# Altium footprint library lib_datalogger.PcbLib: 866 footprints (part 46 of 55)
Each footprint in its own frame and in the unit in brackets; x right, y up, seen from the top. Pads: shape width x height; smd on the part's side, far side on the other; paste and mask are expansions set on the pad; w line width, h text height; cw(c..) or ccw(c..) is an arc to the next point about the centre after c.
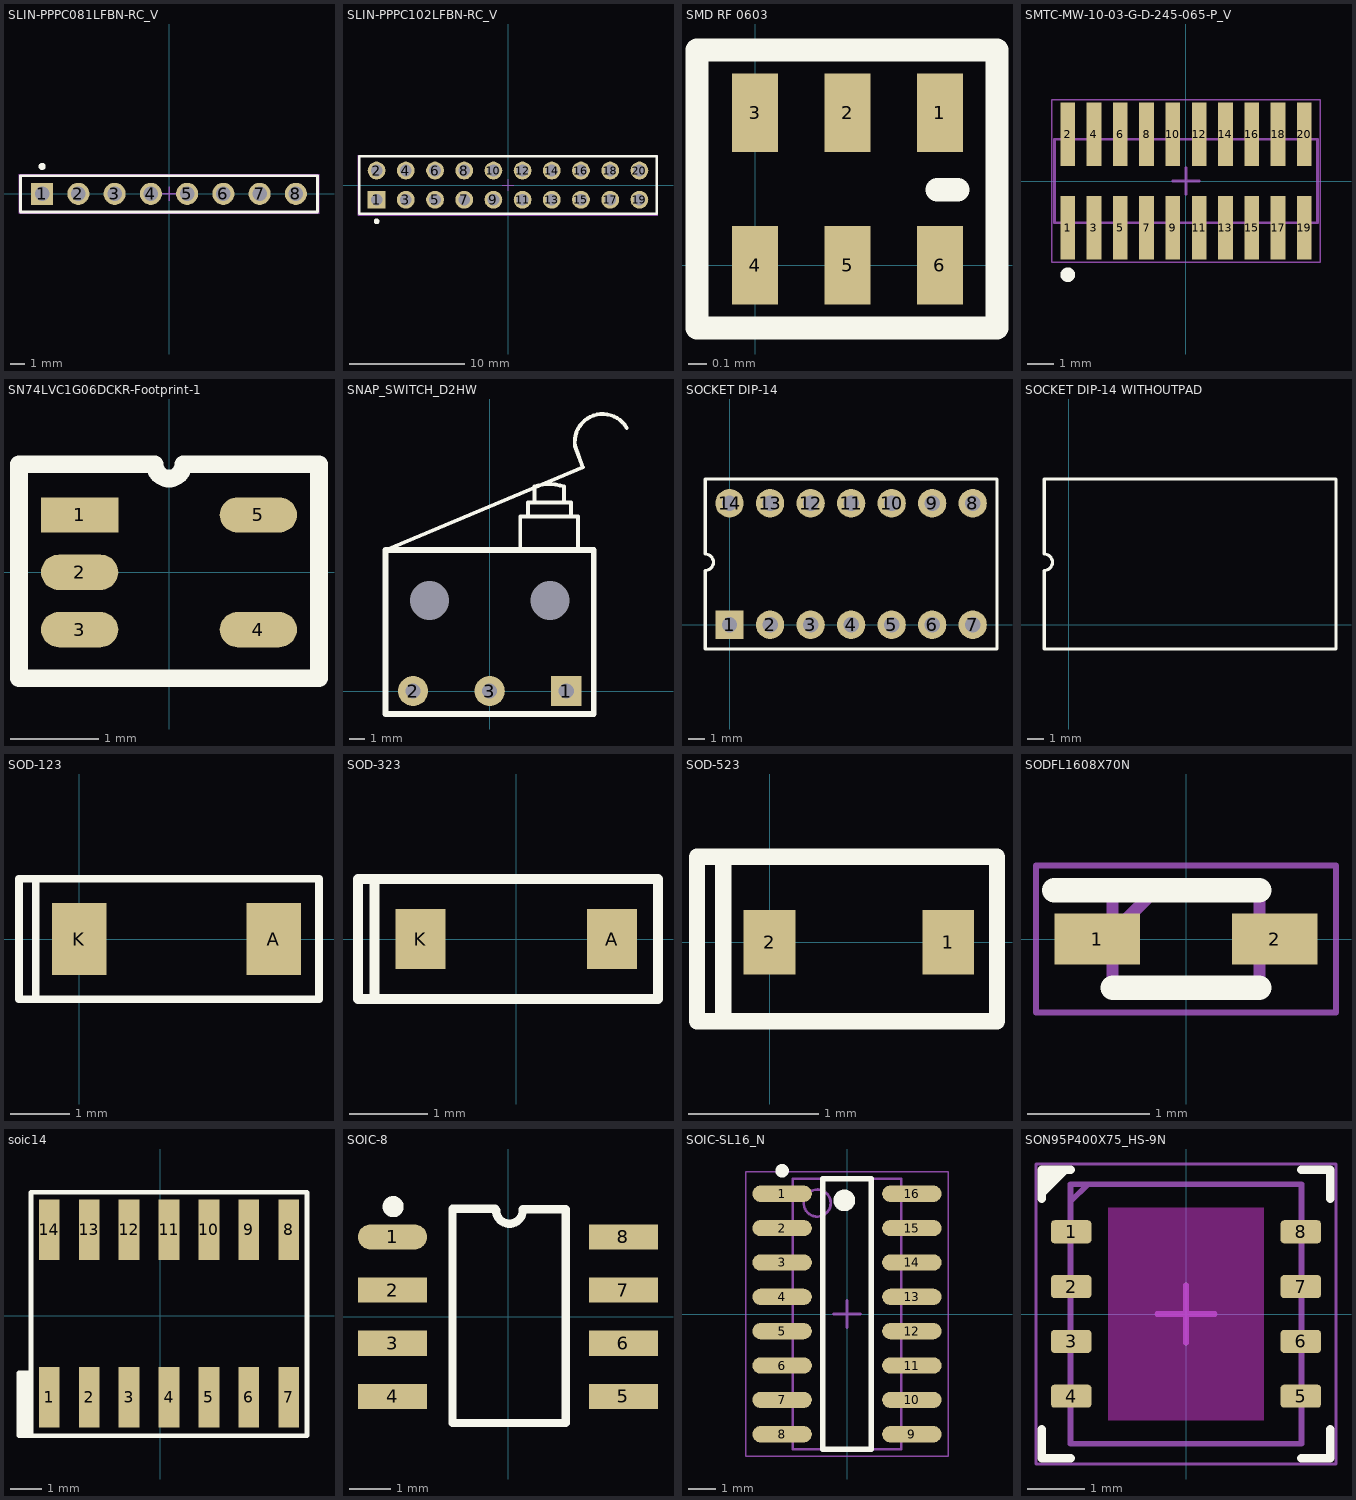
[diagram p45: the footprints below, top view; thin cyan lines are the x and y axes]

## SLIN-PPPC081LFBN-RC_V [mm] "THD, 8-Leads, Body 20.82x2.54mm, Pitch 2.54mm"
height 8.5
pads (8):
  rect 1.55x1.55 hole 1.02: 1(-8.89,0)
  round 1.55 hole 1.02: 2(-6.35,0) 3(-3.81,0) 4(-1.27,0) 5(1.27,0) 6(3.81,0) 7(6.35,0) 8(8.89,0)
Top Overlay:
  circle w0.25: c-8.89,1.92 r0.125
  lines w0.2: -10.41,-1.27 10.41,-1.27 10.41,1.27 -10.41,1.27 -10.41,-1.27
Mechanical 13:
  lines w0.1: -10.41,-1.27 10.41,-1.27 10.41,1.27 -10.41,1.27 -10.41,-1.27
Mechanical 15:
  lines w0.05: -10.51,-1.37 10.51,-1.37 10.51,1.37 -10.51,1.37 -10.51,-1.37
  lines w0.1: -0.5,0 0.5,0 ; 0,-0.5 0,0.5
3D body "_ _ _C081LFBN-RC.STEP": height 8.5, standoff -3.2, extent -10.41,-1.27 10.41,1.27

## SLIN-PPPC102LFBN-RC_V [mm] "THD, 20-Leads, Body 25.9x5mm, Pitch 2.54mm"
height 8.75
pads (20):
  rect 1.55x1.55 hole 1.02: 1(-11.43,-1.27)
  round 1.55 hole 1.02: 2(-11.43,1.27) 3(-8.89,-1.27) 4(-8.89,1.27) 5(-6.35,-1.27) 6(-6.35,1.27) 7(-3.81,-1.27) 8(-3.81,1.27) 9(-1.27,-1.27) 10(-1.27,1.27) 11(1.27,-1.27) 12(1.27,1.27) 13(3.81,-1.27) 14(3.81,1.27) 15(6.35,-1.27) 16(6.35,1.27) 17(8.89,-1.27) 18(8.89,1.27) 19(11.43,-1.27) 20(11.43,1.27)
Top Overlay:
  circle w0.25: c-11.43,-3.15 r0.125
  lines w0.2: -12.95,-2.5 12.95,-2.5 12.95,2.5 -12.95,2.5 -12.95,-2.5
Mechanical 13:
  lines w0.1: 12.95,-2.5 -12.95,-2.5 -12.95,2.5 12.95,2.5 12.95,-2.5 ; 12.95,-2.5 12.95,-2.5
Mechanical 15:
  lines w0.05: -13.05,-2.6 13.05,-2.6 13.05,2.6 -13.05,2.6 -13.05,-2.6
  lines w0.1: -0.5,0 0.5,0 ; 0,-0.5 0,0.5
3D body "_ _ _C102LFBN-RC.STEP": height 8.5, standoff -3.2, extent -12.95,-2.54 12.95,2.54

## SMD RF 0603 [mm]
pads (6):
  rect 0.25x0.425 smd mask+0.03: 1(1,0.825) 2(0.5,0.825) 3(0,0.825) 4(0,0) 5(0.5,0) 6(1,0)
Top Overlay:
  lines w0.127: 0.986,0.408 1.097,0.408 ; -0.315,-0.34 -0.315,1.165 1.309,1.165 1.309,-0.34 -0.315,-0.34

## SMTC-MW-10-03-G-D-245-065-P_V [mm] "CONN, 20-Leads, Body 3.18x10mm, Pitch 1mm"
height 9.4
pads (20):
  rect 0.56x2.41 smd: 1(-4.5,-1.78) 2(-4.5,1.78) 3(-3.5,-1.78) 4(-3.5,1.78) 5(-2.5,-1.78) 6(-2.5,1.78) 7(-1.5,-1.78) 8(-1.5,1.78) 9(-0.5,-1.78) 10(-0.5,1.78) 11(0.5,-1.78) 12(0.5,1.78) 13(1.5,-1.78) 14(1.5,1.78) 15(2.5,-1.78) 16(2.5,1.78) 17(3.5,-1.78) 18(3.5,1.78) 19(4.5,-1.78) 20(4.5,1.78)
Top Overlay:
  circle w0.3: c-4.5,-3.562 r0.127
Mechanical 13:
  lines w0.1: -5,-1.59 -5,1.59 5,1.59 5,-1.59 -5,-1.59
Mechanical 15:
  lines w0.05: -5.1,-3.085 -5.1,3.085 5.1,3.085 5.1,-3.085 -5.1,-3.085
  lines w0.1: -0.5,0 0.5,0 ; 0,-0.5 0,0.5
3D body "MW-10-03-G-D-245-065-P.stp": height 9.39, standoff 0, extent -5,-2.603 5,2.604

## SN74LVC1G06DCKR-Footprint-1 [mm]
pads (5):
  rect 0.875x0.4 smd: 1(-1.012,0.65)
  oval 0.875x0.4 smd: 2(-1.012,0) 3(-1.012,-0.65) 4(1.012,-0.65) 5(1.012,0.65)
Top Overlay:
  lines w0.2: -1.7,-1.2 1.7,-1.2 1.7,1.225 0.162,1.225 cw(c0,1.225) -0.162,1.225 -1.7,1.225 -1.7,-1.2
3D body "DCK0005A.stp": height 0.91, standoff -0.04, extent -1.14,-0.987 1.14,1.013

## SNAP_SWITCH_D2HW [mm]
pads (5):
  rect 2x2 hole 1: 1(5.08,0)
  round 2 hole 1: 2(-5.08,0) 3(0,0)
  round 0 hole 2.6: HOLE(-4,6) HOLE(4,6)
Top Overlay:
  lines w0.254: -5.867,9.347 -6.909,9.347 6.18,14.84 5.66,16.252 ; 2.032,9.296 2.032,11.582 5.867,11.582 5.867,9.347 ; 2.54,11.582 2.54,12.497 5.385,12.497 5.385,11.608 ; 2.972,12.497 2.972,13.564 cw(c3.95,10.503) 4.928,13.564 4.928,12.497 ; 5.659,16.251 cw(c7.489,16.521) 9.091,17.446
  lines w0.381: -6.909,-1.524 6.909,-1.524 6.909,9.347 -6.909,9.347 -6.909,-1.524
3D body "D2HW_BL231DL.step": height 5.3, standoff -5, extent -6.687,-0.19 9.313,18.559

## SOCKET DIP-14 [mil] "DIP; 16 Leads; Row Spacing 7.62 mm; Pitch 2.54 mm"
height 200
pads (14):
  rect 70x70 hole 38: 1(0,0)
  round 70 hole 38: 2(100,0) 3(200,0) 4(300,0) 5(400,0) 6(500,0) 7(600,0) 8(600,300) 9(500,300) 10(400,300) 11(300,300) 12(200,300) 13(100,300) 14(0,300)
Top Overlay:
  lines w7.87: -60,-60 -60,134 ccw(c-60,154.3) -60,174.6 -60,360 660,360 660,-60 -60,-60
3D body "User Library-14 pin IC DIP Socket.STEP": height 177.17, standoff -118.11, extent -50.79,-49.61 650.79,349.61

## SOCKET DIP-14 WITHOUTPAD [mm] "DIP; 16 Leads; Row Spacing 7.62 mm; Pitch 2.54 mm"
height 5.08
Top Overlay:
  lines w0.2: -1.524,-1.524 -1.524,3.404 ccw(c-1.524,3.919) -1.524,4.435 -1.524,9.144 16.764,9.144 16.764,-1.524 -1.524,-1.524
3D body "User Library-14 pin IC DIP Socket.STEP": height 4.5, standoff -3, extent -1.29,-1.26 16.53,8.88

## SOD-123 [mil]
pads (2):
  rect 36x48 smd: A(129,0) K(0,0)
Top Overlay:
  lines w5: -29,-40 -40,-40 -40,40 -29,40 ; -29,-40 159,-40 159,40 -29,40 ; -29,-40 -29,40
3D body "User Library-SOD-123_DiodesInc.step": height 36.42, standoff -20.67, extent -10.79,-33.46 140.79,33.46

## SOD-323 [mil]
pads (2):
  rect 25x30 smd: A(48,0) K(-48,0)
Top Overlay:
  lines w5: -71,-30 -79.35,-30 -79.35,30 -71,30 ; -71,-30 -71,30 ; -71,-30 71,-30 71,30 -71,30
3D body "User Library-SOD-323.step": height 43.5, standoff 0, extent -51.18,-26.57 51.18,26.58

## SOD-523 [mm]
pads (2):
  rect 0.4x0.5 smd mask+0.051: 1(1.377,0) 2(0,0)
Top Overlay:
  lines w0.127: -0.359,0.66 1.753,0.66 1.753,-0.61 -0.356,-0.61 ; -0.356,0.6 -0.356,-0.61 ; -0.356,0.66 -0.559,0.66 -0.559,-0.61 -0.356,-0.61
3D body "User Library-SOD-523F.STEP": height 0.7, standoff 0, extent -0.089,-0.399 1.511,0.399

## SODFL1608X70N [mm]
pads (2):
  rect 0.7x0.42 smd: 1(-0.725,0) 2(0.725,0)
Top Overlay:
  lines w0.2: -1.075,0.4 0.6,0.4 ; -0.6,-0.4 0.6,-0.4
Mechanical 13:
  lines w0.1: -0.6,0.05 -0.25,0.4 ; -0.6,-0.4 -0.6,0.4 0.6,0.4 0.6,-0.4 -0.6,-0.4
Mechanical 15:
  lines w0.05: -1.225,-0.6 -1.225,0.6 1.225,0.6 1.225,-0.6 -1.225,-0.6
3D body "BAT54KFILM.stp": height 0.7, standoff 0, extent -0.8,-0.4 0.8,0.4

## soic14 [mil]
pads (14):
  rect 26x76 smd: 1(-139,-102) 2(-89,-102) 3(-39,-102) 4(11,-102) 5(61,-102) 6(111,-102) 7(161,-102) 8(161,108) 9(111,108) 10(61,108) 11(11,108) 12(-39,108) 13(-89,108) 14(-139,108)
Top Overlay:
  region: -162,-71 -177,-71 -177,-150 -162,-150
  lines w6: -162,-71 -177,-71 -177,-150 -162,-150 ; -162,-150 184,-150 184,155 -162,155 -162,-150
3D body "IC_Texas_Instruments_LM339DR_eec.STEP": height 10, standoff 0, extent -171.09,-140.75 193.09,140.75

## SOIC-8 [mm]
pads (8):
  oval 1.65x0.6 smd mask+0.076: 1(-2.76,1.905)
  rect 1.65x0.6 smd mask+0.076: 2(-2.76,0.635) 3(-2.76,-0.635) 4(-2.76,-1.905) 5(2.76,-1.905) 6(2.76,-0.635) 7(2.76,0.635) 8(2.76,1.905)
Top Overlay:
  circle w0.254: c-2.745,2.629 r0.125
  lines w0.2: -0.309,2.578 -1.325,2.578 -1.325,-2.54 1.38,-2.54 1.38,2.565 0.352,2.565 ; -0.284,2.54 ccw(c0.034,2.54) 0.352,2.54
3D body "User Library-SOIC-8.STEP": height 1.75, standoff 0, extent -2.978,-2.5 3.033,2.5

## SOIC-SL16_N [mm] "SOIC, 16-Leads, Body 9.9x3.9mm, Pitch 1.27mm, IPC Medium Density"
height 1.75
pads (16):
  oval 2.2x0.6 smd: 1(-2.4,4.445) 2(-2.4,3.175) 3(-2.4,1.905) 4(-2.4,0.635) 5(-2.4,-0.635) 6(-2.4,-1.905) 7(-2.4,-3.175) 8(-2.4,-4.445) 9(2.4,-4.445) 10(2.4,-3.175) 11(2.4,-1.905) 12(2.4,-0.635) 13(2.4,0.635) 14(2.4,1.905) 15(2.4,3.175) 16(2.4,4.445)
Top Overlay:
  circle w0.4: c-0.1,4.2 r0.2
  circle w0.25: c-2.4,5.295 r0.125
  lines w0.2: -0.9,-5 0.9,-5 0.9,5 -0.9,5 -0.9,-5
Mechanical 13:
  circle w0.1: c-1.1,4.1 r0.5
  lines w0.1: -2,-5 2,-5 2,5 -2,5 -2,-5
Mechanical 15:
  lines w0.05: -3.75,-5.25 3.75,-5.25 3.75,5.25 -3.75,5.25 -3.75,-5.25
  lines w0.1: -0.5,0 0.5,0 ; 0,-0.5 0,0.5
3D body: height 1.75, standoff 0.1, extent -2,-5 2,5

## SON95P400X75_HS-9N [mm] "SON, 8-Leads, Body 4,50x4,00mm, Pitch 0,95mm, Thermal Pad 2,61x2,88mm, IPC Medium Density"
height 0.75
pads (8):
  rrect30% 0.7x0.4 smd: 1(-1.99,1.425) 2(-1.99,0.475) 3(-1.99,-0.475) 4(-1.99,-1.425) 5(1.99,-1.425) 6(1.99,-0.475) 7(1.99,0.475) 8(1.99,1.425)
Top Layer keep-out:
  rectangle: -1.35,-1.85 1.35,1.85
Top Overlay:
  region: -2.5,2.5 -2.5,2.1 -2.1,2.5
  lines w0.15: -2.5,-2 -2.5,-2.5 -2,-2.5 ; -2.5,2 -2.5,2.5 -2,2.5 ; -2.5,2.1 -2.1,2.5 ; 2,-2.5 2.5,-2.5 2.5,-2 ; 2,2.5 2.5,2.5 2.5,2
Mechanical 13:
  lines w0.1: -2,1.9 -2,1.95 -1.7,2.25 ; -2,-2.25 -2,2.25 2,2.25 2,-2.25 -2,-2.25
Mechanical 15:
  lines w0.05: -2.6,-2.6 -2.6,2.6 2.6,2.6 2.6,-2.6 -2.6,-2.6
  lines w0.1: -0.5,0 0.5,0 ; 0,-0.5 0,0.5
Top Designator:
  text ".Designator" at -1.27,0.254 h0.6
3D body "DFN-8-EP-4x45-095pitch.STEP": height 0.77, standoff 0, extent -2,-2.25 2,2.25